# Altium schematic symbol library Analog Devices Operational Amplifiers.SchLib: 2102 symbols (part 24 of 35) (continued)
## ADA4084-2ARMZ-R7
designator U?
Double Channel Low Power Operational Amplifier, 12.3 MHz BW, 2.6 V/us SR, Industrial, 8-pin SOP (RM-8), Reel; Generic Part Number: ADA4084-2; Manufacturer: Analog Devices; PartNumber: ADA4084-2ARMZ-R7; Amplifiers Per Package: 2; Input Bias Current: 140nA; Input Offset Voltage: 100uV; Iq/Amp: 595uA; V Span Max: 30V; V Span Min: 3V; DatasheetVersion: Rev. B; PackageReference: RM-8; PackageDescription: 8-Pin Mini Small Outline Package, Body 3 x 3 mm, Pitch 0.65 mm; Supplier 1: Digi-Key; Supplier Part Number 1: ADA4084-2ARMZ-R7TR-ND; Supplier 2: Digi-Key; Supplier Part Number 2: ADA4084-2ARMZ-R7CT-ND; Supplier 3: Digi-Key; Supplier Part Number 3: ADA4084-2ARMZ-R7DKR-ND; Supplier 4: Newark; Supplier Part Number 4: 72T3470; Packing: Reel; Slew Rate: 2.6V/us; Small Signal Bandwidth: 12.3MHz; Mounting Technology: Surface Mount; Code_JEDEC: MO-187-AA; ComponentLink1Description: Manufacturer URL; ComponentLink1URL: http://www.analog.com/en/index.html; ComponentLink2Description: Datasheet; ComponentLink2URL: http://www.analog.com/static/imported-files/data_sheets/ADA4084-2.pdf; ComponentLink3Description: Package Specification; ComponentLink3URL: http://www.analog.com/static/imported-files/packages/PKG_PDF/MSOP%28RM%29/RM_8.pdf
footprint ADI-RM-8_N (SOP, 8-Leads, Body 3x3mm, Pitch 0.65mm, IPC Medium Density)
footprint ADI-RM-8_L (SOP, 8-Leads, Body 3x3mm, Pitch 0.65mm, IPC High Density)
footprint ADI-RM-8_M (SOP, 8-Leads, Body 3x3mm, Pitch 0.65mm, IPC Low Density)
pins on every part: 4 -V (power), 8 +V (power)
part A pins: 1 OUT A (out), 2 -IN A (in), 3 +IN A (in)
part B pins: 5 +IN B (in), 6 -IN B (in), 7 OUT B (out)

## ADA4084-2ARMZ-RL
designator U?
Double Channel Low Power Operational Amplifier, 12.3 MHz BW, 2.6 V/us SR, Industrial, 8-pin SOP (RM-8), Reel; Generic Part Number: ADA4084-2; Manufacturer: Analog Devices; PartNumber: ADA4084-2ARMZ-RL; Amplifiers Per Package: 2; Input Bias Current: 140nA; Input Offset Voltage: 100uV; Iq/Amp: 595uA; V Span Max: 30V; V Span Min: 3V; DatasheetVersion: Rev. B; PackageReference: RM-8; PackageDescription: 8-Pin Mini Small Outline Package, Body 3 x 3 mm, Pitch 0.65 mm; Supplier 1: Digi-Key; Supplier Part Number 1: ADA4084-2ARMZ-RL-ND; Supplier 2: Newark; Supplier Part Number 2: 72T3469; Packing: Reel; Slew Rate: 2.6V/us; Small Signal Bandwidth: 12.3MHz; Mounting Technology: Surface Mount; Code_JEDEC: MO-187-AA; ComponentLink1Description: Manufacturer URL; ComponentLink1URL: http://www.analog.com/en/index.html; ComponentLink2Description: Datasheet; ComponentLink2URL: http://www.analog.com/static/imported-files/data_sheets/ADA4084-2.pdf; ComponentLink3Description: Package Specification; ComponentLink3URL: http://www.analog.com/static/imported-files/packages/PKG_PDF/MSOP%28RM%29/RM_8.pdf
footprint ADI-RM-8_N (SOP, 8-Leads, Body 3x3mm, Pitch 0.65mm, IPC Medium Density)
footprint ADI-RM-8_L (SOP, 8-Leads, Body 3x3mm, Pitch 0.65mm, IPC High Density)
footprint ADI-RM-8_M (SOP, 8-Leads, Body 3x3mm, Pitch 0.65mm, IPC Low Density)
pins on every part: 4 -V (power), 8 +V (power)
part A pins: 1 OUT A (out), 2 -IN A (in), 3 +IN A (in)
part B pins: 5 +IN B (in), 6 -IN B (in), 7 OUT B (out)

## ADA4084-2ARZ
designator U?
Double Channel Low Power Operational Amplifier, 12.3 MHz BW, 2.6 V/us SR, Industrial, 8-pin SOIC (R-8), Tube; Generic Part Number: ADA4084-2; Manufacturer: Analog Devices; PartNumber: ADA4084-2ARZ; Amplifiers Per Package: 2; Input Bias Current: 140nA; Input Offset Voltage: 100uV; Iq/Amp: 595uA; V Span Max: 30V; V Span Min: 3V; DatasheetVersion: Rev. B; PackageVersion: 060506-A; PackageReference: R-8; PackageDescription: 8-Pin Standard Small Outline Package, Body 3.9 x 4.9 mm, Pitch 1.27 mm; Supplier 1: Digi-Key; Supplier Part Number 1: ADA4084-2ARZ-ND; Supplier 2: Farnell; Supplier Part Number 2: 2070703; Supplier 3: Newark; Supplier Part Number 3: 72T3471; Packing: Tube; Slew Rate: 2.6V/us; Small Signal Bandwidth: 12.3MHz; Mounting Technology: Surface Mount; Code_JEDEC: MS-012-AA; ComponentLink1Description: Manufacturer URL; ComponentLink1URL: http://www.analog.com/en/index.html; ComponentLink2Description: Datasheet; ComponentLink2URL: http://www.analog.com/static/imported-files/data_sheets/ADA4084-2.pdf; ComponentLink3Description: Package Specification; ComponentLink3URL: http://www.analog.com/static/imported-files/packages/PKG_PDF/SOIC_Narrow%20(R)/R_8.pdf
footprint ADI-R-8_N (SOIC, 8-Leads, Body 4.9x3.9mm, Pitch 1.27mm, IPC Medium Density)
footprint ADI-R-8_L (SOIC, 8-Leads, Body 4.9x3.9mm, Pitch 1.27mm, IPC High Density)
footprint ADI-R-8_M (SOIC, 8-Leads, Body 4.9x3.9mm, Pitch 1.27mm, IPC Low Density)
pins on every part: 4 -V (power), 8 +V (power)
part A pins: 1 OUT A (out), 2 -IN A (in), 3 +IN A (in)
part B pins: 5 +IN B (in), 6 -IN B (in), 7 OUT B (out)

## ADA4084-2ARZ-R7
designator U?
Double Channel Low Power Operational Amplifier, 12.3 MHz BW, 2.6 V/us SR, Industrial, 8-pin SOIC (R-8), Reel; Generic Part Number: ADA4084-2; Manufacturer: Analog Devices; PartNumber: ADA4084-2ARZ-R7; Amplifiers Per Package: 2; Input Bias Current: 140nA; Input Offset Voltage: 100uV; Iq/Amp: 595uA; V Span Max: 30V; V Span Min: 3V; DatasheetVersion: Rev. B; PackageVersion: 060506-A; PackageReference: R-8; PackageDescription: 8-Pin Standard Small Outline Package, Body 3.9 x 4.9 mm, Pitch 1.27 mm; Supplier 1: Digi-Key; Supplier Part Number 1: ADA4084-2ARZ-R7TR-ND; Supplier 2: Digi-Key; Supplier Part Number 2: ADA4084-2ARZ-R7CT-ND; Supplier 3: Digi-Key; Supplier Part Number 3: ADA4084-2ARZ-R7DKR-ND; Supplier 4: Newark; Supplier Part Number 4: 72T3473; Packing: Reel; Slew Rate: 2.6V/us; Small Signal Bandwidth: 12.3MHz; Mounting Technology: Surface Mount; Code_JEDEC: MS-012-AA; ComponentLink1Description: Manufacturer URL; ComponentLink1URL: http://www.analog.com/en/index.html; ComponentLink2Description: Datasheet; ComponentLink2URL: http://www.analog.com/static/imported-files/data_sheets/ADA4084-2.pdf; ComponentLink3Description: Package Specification; ComponentLink3URL: http://www.analog.com/static/imported-files/packages/PKG_PDF/SOIC_Narrow%20(R)/R_8.pdf
footprint ADI-R-8_N (SOIC, 8-Leads, Body 4.9x3.9mm, Pitch 1.27mm, IPC Medium Density)
footprint ADI-R-8_L (SOIC, 8-Leads, Body 4.9x3.9mm, Pitch 1.27mm, IPC High Density)
footprint ADI-R-8_M (SOIC, 8-Leads, Body 4.9x3.9mm, Pitch 1.27mm, IPC Low Density)
pins on every part: 4 -V (power), 8 +V (power)
part A pins: 1 OUT A (out), 2 -IN A (in), 3 +IN A (in)
part B pins: 5 +IN B (in), 6 -IN B (in), 7 OUT B (out)

## ADA4084-2ARZ-RL
designator U?
Double Channel Low Power Operational Amplifier, 12.3 MHz BW, 2.6 V/us SR, Industrial, 8-pin SOIC (R-8), Reel; Generic Part Number: ADA4084-2; Manufacturer: Analog Devices; PartNumber: ADA4084-2ARZ-RL; Amplifiers Per Package: 2; Input Bias Current: 140nA; Input Offset Voltage: 100uV; Iq/Amp: 595uA; V Span Max: 30V; V Span Min: 3V; DatasheetVersion: Rev. B; PackageVersion: 060506-A; PackageReference: R-8; PackageDescription: 8-Pin Standard Small Outline Package, Body 3.9 x 4.9 mm, Pitch 1.27 mm; Supplier 1: Digi-Key; Supplier Part Number 1: ADA4084-2ARZ-RL-ND; Packing: Reel; Slew Rate: 2.6V/us; Small Signal Bandwidth: 12.3MHz; Mounting Technology: Surface Mount; Code_JEDEC: MS-012-AA; ComponentLink1Description: Manufacturer URL; ComponentLink1URL: http://www.analog.com/en/index.html; ComponentLink2Description: Datasheet; ComponentLink2URL: http://www.analog.com/static/imported-files/data_sheets/ADA4084-2.pdf; ComponentLink3Description: Package Specification; ComponentLink3URL: http://www.analog.com/static/imported-files/packages/PKG_PDF/SOIC_Narrow%20(R)/R_8.pdf
footprint ADI-R-8_N (SOIC, 8-Leads, Body 4.9x3.9mm, Pitch 1.27mm, IPC Medium Density)
footprint ADI-R-8_L (SOIC, 8-Leads, Body 4.9x3.9mm, Pitch 1.27mm, IPC High Density)
footprint ADI-R-8_M (SOIC, 8-Leads, Body 4.9x3.9mm, Pitch 1.27mm, IPC Low Density)
pins on every part: 4 -V (power), 8 +V (power)
part A pins: 1 OUT A (out), 2 -IN A (in), 3 +IN A (in)
part B pins: 5 +IN B (in), 6 -IN B (in), 7 OUT B (out)

## ADA4091-2ACPZ-R2
designator U?
Double Channel Rail-to-Rail Operational Amplifier, 1.27 MHz BW, 460 mV/us SR, Industrial, 8-pin QFN (CP-8-9), Reel; Generic Part Number: ADA4091-2; Manufacturer: Analog Devices; PartNumber: ADA4091-2ACPZ-R2; Amplifiers Per Package: 2; Input Bias Current: 50nA; Input Offset Voltage: 35uV; Iq/Amp: 200uA; V Span Max: 30V; V Span Min: 3V; DatasheetVersion: Rev. F; PackageVersion: 051909-A; PackageReference: CP-8-9; PackageDescription: 8-Pin Lead Frame Chip Scale Package, Body 3 x 3 mm, Pitch 0.5 mm; Supplier 1: Digi-Key; Supplier Part Number 1: ADA4091-2ACPZ-R2TR-ND; Supplier 2: Digi-Key; Supplier Part Number 2: ADA4091-2ACPZ-R2CT-ND; Supplier 3: Digi-Key; Supplier Part Number 3: ADA4091-2ACPZ-R2DKR-ND; Supplier 4: Newark; Supplier Part Number 4: 52R8019; Slew Rate: 460mV/us; Small Signal Bandwidth: 1.27MHz; Mounting Technology: Surface Mount; ComponentLink1Description: Manufacturer URL; ComponentLink1URL: http://www.analog.com/en/index.html; ComponentLink2Description: Datasheet; ComponentLink2URL: http://www.analog.com/static/imported-files/data_sheets/ADA4091-2_4091-4.pdf; ComponentLink3Description: Package Specification; ComponentLink3URL: http://www.analog.com/static/imported-files/packages/PKG_PDF/LFCSP(CP)/CP_8_9.pdf; ComponentLink4Description: Reference Circuit; ComponentLink4URL: http://www.analog.com/en/all-operational-amplifiers-op-amps/operational-amplifiers-op-amps/ada4091-2/products/product.html#product-recommendations
footprint ADI-CP-8-9_N (QFN, 8-Leads, Body 3x3mm, Pitch 0.5mm, Thermal Pad 1.5x2.13mm, IPC Medium Density)
footprint ADI-CP-8-9_L (QFN, 8-Leads, Body 3x3mm, Pitch 0.5mm, Thermal Pad 1.5x2.13mm, IPC High Density)
footprint ADI-CP-8-9_M (QFN, 8-Leads, Body 3x3mm, Pitch 0.5mm, Thermal Pad 1.5x2.13mm, IPC Low Density)
pins on every part: 4 -V (power), 8 +V (power), 9 EP (power)
part A pins: 1 OUT A (out), 2 -IN A (in), 3 +IN A (in)
part B pins: 5 +IN B (in), 6 -IN B (in), 7 OUT B (out)

## ADA4091-2ACPZ-R7
designator U?
Double Channel Rail-to-Rail Operational Amplifier, 1.27 MHz BW, 460 mV/us SR, Industrial, 8-pin QFN (CP-8-9), Reel; Generic Part Number: ADA4091-2; Manufacturer: Analog Devices; PartNumber: ADA4091-2ACPZ-R7; Amplifiers Per Package: 2; Input Bias Current: 50nA; Input Offset Voltage: 35uV; Iq/Amp: 200uA; V Span Max: 30V; V Span Min: 3V; DatasheetVersion: Rev. F; PackageVersion: 051909-A; PackageReference: CP-8-9; PackageDescription: 8-Pin Lead Frame Chip Scale Package, Body 3 x 3 mm, Pitch 0.5 mm; Supplier 1: Digi-Key; Supplier Part Number 1: ADA4091-2ACPZ-R7-ND; Supplier 2: Newark; Supplier Part Number 2: 52R8020; Slew Rate: 460mV/us; Small Signal Bandwidth: 1.27MHz; Mounting Technology: Surface Mount; ComponentLink1Description: Manufacturer URL; ComponentLink1URL: http://www.analog.com/en/index.html; ComponentLink2Description: Datasheet; ComponentLink2URL: http://www.analog.com/static/imported-files/data_sheets/ADA4091-2_4091-4.pdf; ComponentLink3Description: Package Specification; ComponentLink3URL: http://www.analog.com/static/imported-files/packages/PKG_PDF/LFCSP(CP)/CP_8_9.pdf; ComponentLink4Description: Reference Circuit; ComponentLink4URL: http://www.analog.com/en/all-operational-amplifiers-op-amps/operational-amplifiers-op-amps/ada4091-2/products/product.html#product-recommendations
footprint ADI-CP-8-9_N (QFN, 8-Leads, Body 3x3mm, Pitch 0.5mm, Thermal Pad 1.5x2.13mm, IPC Medium Density)
footprint ADI-CP-8-9_L (QFN, 8-Leads, Body 3x3mm, Pitch 0.5mm, Thermal Pad 1.5x2.13mm, IPC High Density)
footprint ADI-CP-8-9_M (QFN, 8-Leads, Body 3x3mm, Pitch 0.5mm, Thermal Pad 1.5x2.13mm, IPC Low Density)
pins on every part: 4 -V (power), 8 +V (power), 9 EP (power)
part A pins: 1 OUT A (out), 2 -IN A (in), 3 +IN A (in)
part B pins: 5 +IN B (in), 6 -IN B (in), 7 OUT B (out)

## ADA4091-2ACPZ-RL
designator U?
Double Channel Rail-to-Rail Operational Amplifier, 1.27 MHz BW, 460 mV/us SR, Industrial, 8-pin QFN (CP-8-9), Reel; Generic Part Number: ADA4091-2; Manufacturer: Analog Devices; PartNumber: ADA4091-2ACPZ-RL; Amplifiers Per Package: 2; Input Bias Current: 50nA; Input Offset Voltage: 35uV; Iq/Amp: 200uA; V Span Max: 30V; V Span Min: 3V; DatasheetVersion: Rev. F; PackageVersion: 051909-A; PackageReference: CP-8-9; PackageDescription: 8-Pin Lead Frame Chip Scale Package, Body 3 x 3 mm, Pitch 0.5 mm; Supplier 1: Digi-Key; Supplier Part Number 1: ADA4091-2ACPZ-RL-ND; Slew Rate: 460mV/us; Small Signal Bandwidth: 1.27MHz; Mounting Technology: Surface Mount; ComponentLink1Description: Manufacturer URL; ComponentLink1URL: http://www.analog.com/en/index.html; ComponentLink2Description: Datasheet; ComponentLink2URL: http://www.analog.com/static/imported-files/data_sheets/ADA4091-2_4091-4.pdf; ComponentLink3Description: Package Specification; ComponentLink3URL: http://www.analog.com/static/imported-files/packages/PKG_PDF/LFCSP(CP)/CP_8_9.pdf; ComponentLink4Description: Reference Circuit; ComponentLink4URL: http://www.analog.com/en/all-operational-amplifiers-op-amps/operational-amplifiers-op-amps/ada4091-2/products/product.html#product-recommendations
footprint ADI-CP-8-9_N (QFN, 8-Leads, Body 3x3mm, Pitch 0.5mm, Thermal Pad 1.5x2.13mm, IPC Medium Density)
footprint ADI-CP-8-9_L (QFN, 8-Leads, Body 3x3mm, Pitch 0.5mm, Thermal Pad 1.5x2.13mm, IPC High Density)
footprint ADI-CP-8-9_M (QFN, 8-Leads, Body 3x3mm, Pitch 0.5mm, Thermal Pad 1.5x2.13mm, IPC Low Density)
pins on every part: 4 -V (power), 8 +V (power), 9 EP (power)
part A pins: 1 OUT A (out), 2 -IN A (in), 3 +IN A (in)
part B pins: 5 +IN B (in), 6 -IN B (in), 7 OUT B (out)

## ADA4091-2ARZ
designator U?
Double Channel Rail-to-Rail Operational Amplifier, 1.27 MHz BW, 460 mV/us SR, Industrial, 8-pin SOIC (R-8), Tube; Generic Part Number: ADA4091-2; Manufacturer: Analog Devices; PartNumber: ADA4091-2ARZ; Amplifiers Per Package: 2; Input Bias Current: 50nA; Input Offset Voltage: 35uV; Iq/Amp: 200uA; V Span Max: 30V; V Span Min: 3V; DatasheetVersion: Rev. F; PackageVersion: 060506-A; PackageReference: R-8; PackageDescription: 8-Pin Standard Small Outline Package, Body 3.9 x 4.9 mm, Pitch 1.27 mm; Supplier 1: Digi-Key; Supplier Part Number 1: ADA4091-2ARZ-ND; Supplier 2: Farnell; Supplier Part Number 2: 1702289; Supplier 3: Newark; Supplier Part Number 3: 34P2964; Slew Rate: 460mV/us; Small Signal Bandwidth: 1.27MHz; Mounting Technology: Surface Mount; Code_JEDEC: MS-012-AA; ComponentLink1Description: Manufacturer URL; ComponentLink1URL: http://www.analog.com/en/index.html; ComponentLink2Description: Datasheet; ComponentLink2URL: http://www.analog.com/static/imported-files/data_sheets/ADA4091-2_4091-4.pdf; ComponentLink3Description: Package Specification; ComponentLink3URL: http://www.analog.com/static/imported-files/packages/PKG_PDF/SOIC_Narrow%20(R)/R_8.pdf; ComponentLink4Description: Reference Circuit; ComponentLink4URL: http://www.analog.com/en/all-operational-amplifiers-op-amps/operational-amplifiers-op-amps/ada4091-2/products/product.html#product-recommendations
footprint ADI-R-8_N (SOIC, 8-Leads, Body 4.9x3.9mm, Pitch 1.27mm, IPC Medium Density)
footprint ADI-R-8_L (SOIC, 8-Leads, Body 4.9x3.9mm, Pitch 1.27mm, IPC High Density)
footprint ADI-R-8_M (SOIC, 8-Leads, Body 4.9x3.9mm, Pitch 1.27mm, IPC Low Density)
pins on every part: 4 -V (power), 8 +V (power)
part A pins: 1 OUT A (out), 2 -IN A (in), 3 +IN A (in)
part B pins: 5 +IN B (in), 6 -IN B (in), 7 OUT B (out)

## ADA4091-2ARZ-R7
designator U?
Double Channel Rail-to-Rail Operational Amplifier, 1.27 MHz BW, 460 mV/us SR, Industrial, 8-pin SOIC (R-8), Reel; Generic Part Number: ADA4091-2; Manufacturer: Analog Devices; PartNumber: ADA4091-2ARZ-R7; Amplifiers Per Package: 2; Input Bias Current: 50nA; Input Offset Voltage: 35uV; Iq/Amp: 200uA; V Span Max: 30V; V Span Min: 3V; DatasheetVersion: Rev. F; PackageVersion: 060506-A; PackageReference: R-8; PackageDescription: 8-Pin Standard Small Outline Package, Body 3.9 x 4.9 mm, Pitch 1.27 mm; Supplier 1: Digi-Key; Supplier Part Number 1: ADA4091-2ARZ-R7-ND; Supplier 2: Newark; Supplier Part Number 2: 34P2966; Slew Rate: 460mV/us; Small Signal Bandwidth: 1.27MHz; Mounting Technology: Surface Mount; Code_JEDEC: MS-012-AA; ComponentLink1Description: Manufacturer URL; ComponentLink1URL: http://www.analog.com/en/index.html; ComponentLink2Description: Datasheet; ComponentLink2URL: http://www.analog.com/static/imported-files/data_sheets/ADA4091-2_4091-4.pdf; ComponentLink3Description: Package Specification; ComponentLink3URL: http://www.analog.com/static/imported-files/packages/PKG_PDF/SOIC_Narrow%20(R)/R_8.pdf; ComponentLink4Description: Reference Circuit; ComponentLink4URL: http://www.analog.com/en/all-operational-amplifiers-op-amps/operational-amplifiers-op-amps/ada4091-2/products/product.html#product-recommendations
footprint ADI-R-8_N (SOIC, 8-Leads, Body 4.9x3.9mm, Pitch 1.27mm, IPC Medium Density)
footprint ADI-R-8_L (SOIC, 8-Leads, Body 4.9x3.9mm, Pitch 1.27mm, IPC High Density)
footprint ADI-R-8_M (SOIC, 8-Leads, Body 4.9x3.9mm, Pitch 1.27mm, IPC Low Density)
pins on every part: 4 -V (power), 8 +V (power)
part A pins: 1 OUT A (out), 2 -IN A (in), 3 +IN A (in)
part B pins: 5 +IN B (in), 6 -IN B (in), 7 OUT B (out)

## ADA4091-2ARZ-RL
designator U?
Double Channel Rail-to-Rail Operational Amplifier, 1.27 MHz BW, 460 mV/us SR, Industrial, 8-pin SOIC (R-8), Reel; Generic Part Number: ADA4091-2; Manufacturer: Analog Devices; PartNumber: ADA4091-2ARZ-RL; Amplifiers Per Package: 2; Input Bias Current: 50nA; Input Offset Voltage: 35uV; Iq/Amp: 200uA; V Span Max: 30V; V Span Min: 3V; DatasheetVersion: Rev. F; PackageVersion: 060506-A; PackageReference: R-8; PackageDescription: 8-Pin Standard Small Outline Package, Body 3.9 x 4.9 mm, Pitch 1.27 mm; Supplier 1: Digi-Key; Supplier Part Number 1: ADA4091-2ARZ-RL-ND; Supplier 2: Newark; Supplier Part Number 2: 34P2965; Slew Rate: 460mV/us; Small Signal Bandwidth: 1.27MHz; Mounting Technology: Surface Mount; Code_JEDEC: MS-012-AA; ComponentLink1Description: Manufacturer URL; ComponentLink1URL: http://www.analog.com/en/index.html; ComponentLink2Description: Datasheet; ComponentLink2URL: http://www.analog.com/static/imported-files/data_sheets/ADA4091-2_4091-4.pdf; ComponentLink3Description: Package Specification; ComponentLink3URL: http://www.analog.com/static/imported-files/packages/PKG_PDF/SOIC_Narrow%20(R)/R_8.pdf; ComponentLink4Description: Reference Circuit; ComponentLink4URL: http://www.analog.com/en/all-operational-amplifiers-op-amps/operational-amplifiers-op-amps/ada4091-2/products/product.html#product-recommendations
footprint ADI-R-8_N (SOIC, 8-Leads, Body 4.9x3.9mm, Pitch 1.27mm, IPC Medium Density)
footprint ADI-R-8_L (SOIC, 8-Leads, Body 4.9x3.9mm, Pitch 1.27mm, IPC High Density)
footprint ADI-R-8_M (SOIC, 8-Leads, Body 4.9x3.9mm, Pitch 1.27mm, IPC Low Density)
pins on every part: 4 -V (power), 8 +V (power)
part A pins: 1 OUT A (out), 2 -IN A (in), 3 +IN A (in)
part B pins: 5 +IN B (in), 6 -IN B (in), 7 OUT B (out)

## ADA4091-4ACPZ-R2
designator U?
Quad Channel Rail-to-Rail Operational Amplifier, 1.27 MHz BW, 460 mV/us SR, Industrial, 16-pin QFN (CP-16-17), Reel; Generic Part Number: ADA4091-4; Manufacturer: Analog Devices; PartNumber: ADA4091-4ACPZ-R2; Amplifiers Per Package: 4; Input Bias Current: 50nA; Input Offset Voltage: 35uV; Iq/Amp: 200uA; V Span Max: 30V; V Span Min: 3V; DatasheetVersion: Rev. F; PackageVersion: 08-16-2010-C; PackageReference: CP-16-17; PackageDescription: 16-Pin Lead Frame Chip Scale Package, Body 4 x 4 mm, Pitch 0.65 mm; Supplier 1: Digi-Key; Supplier Part Number 1: ADA4091-4ACPZ-R2TR-ND; Supplier 2: Digi-Key; Supplier Part Number 2: ADA4091-4ACPZ-R2CT-ND; Supplier 3: Digi-Key; Supplier Part Number 3: ADA4091-4ACPZ-R2DKR-ND; Supplier 4: Newark; Supplier Part Number 4: 74R5830; Slew Rate: 460mV/us; Small Signal Bandwidth: 1.27MHz; Mounting Technology: Surface Mount; Code_JEDEC: MO-220-WGGC; ComponentLink1Description: Manufacturer URL; ComponentLink1URL: http://www.analog.com/en/index.html; ComponentLink2Description: Datasheet; ComponentLink2URL: http://www.analog.com/static/imported-files/data_sheets/ADA4091-2_4091-4.pdf; ComponentLink3Description: Package Specification; ComponentLink3URL: http://www.analog.com/static/imported-files/packages/PKG_PDF/LFCSP(CP)/CP_16_17.pdf; ComponentLink4Description: Reference Circuit; ComponentLink4URL: http://www.analog.com/en/all-operational-amplifiers-op-amps/operational-amplifiers-op-amps/ada4091-4/products/product.html#product-recommendations
footprint ADI-CP-16-17_N (QFN, 16-Leads, Body 4x4mm, Pitch 0.65mm, Thermal Pad 2.60x2.60mm, IPC Medium Density)
footprint ADI-CP-16-17_L (QFN, 16-Leads, Body 4x4mm, Pitch 0.65mm, Thermal Pad 2.60x2.60mm, IPC High Density)
footprint ADI-CP-16-17_M (QFN, 16-Leads, Body 4x4mm, Pitch 0.65mm, Thermal Pad 2.60x2.60mm, IPC Low Density)
part A pins: 1 -IN A (in), 2 +IN A (in), 15 OUT A (out)
part B pins: 4 +IN B (in), 5 -IN B (in), 6 OUT B (out)
part C pins: 7 OUT C (out), 8 -IN C (in), 9 +IN C (in)
part D pins: 11 +IN D (in), 12 -IN D (in), 14 OUT D (out)
part E pins: 3 +V (power), 10 -V (power), 13 NC, 16 NC, 17 EP (power) "IT IS RECOMMENDED THAT THE EXPOSED PAD BE CONNECTED TO V-."

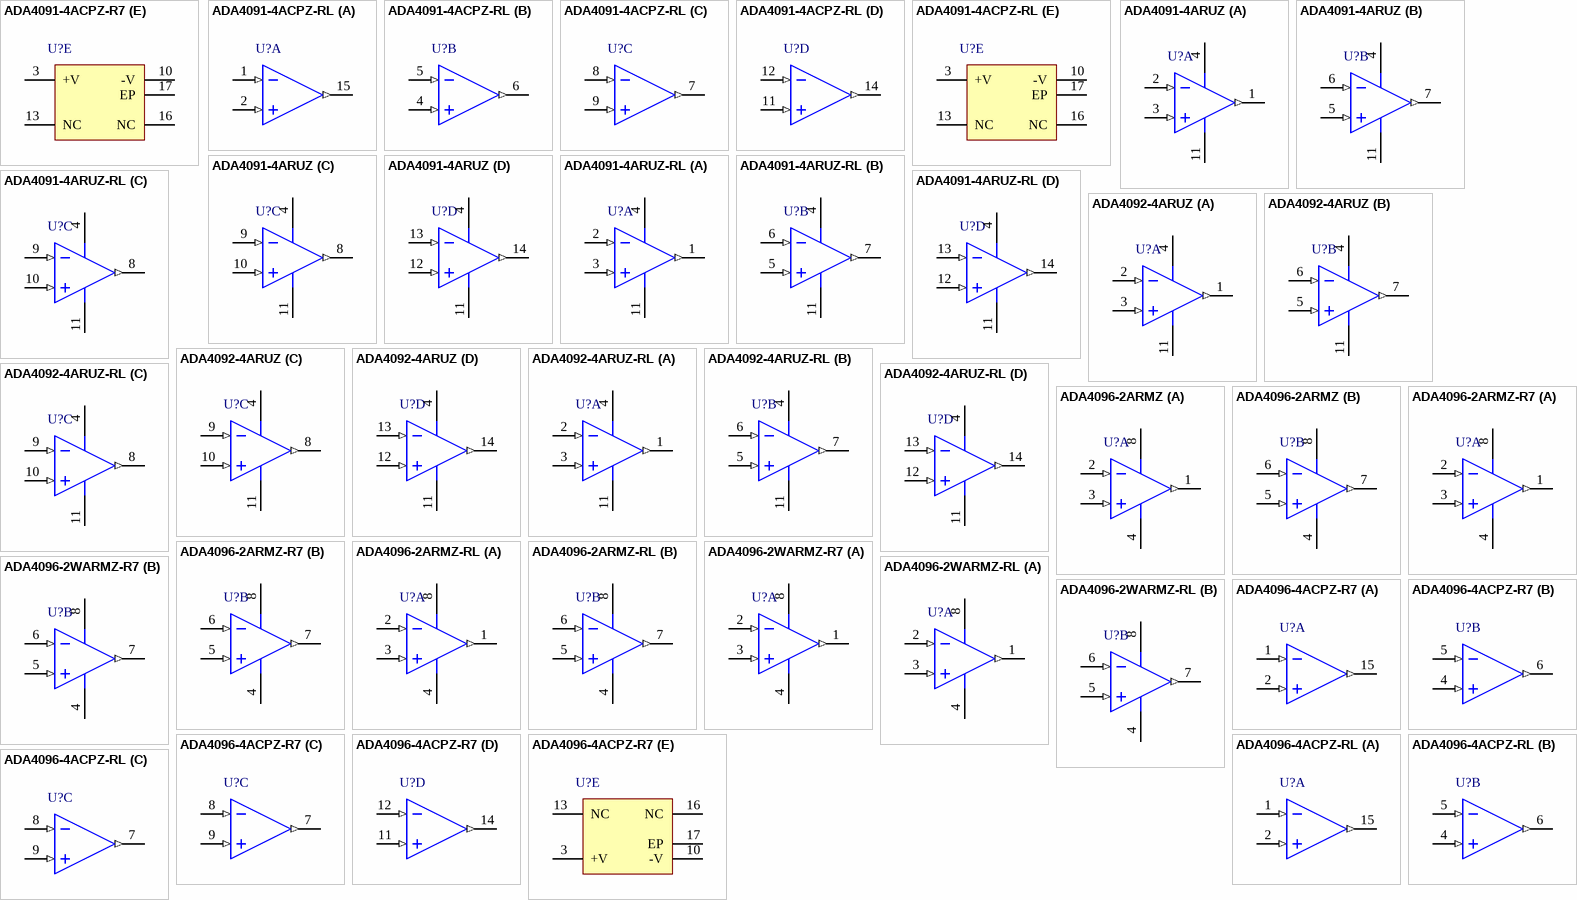
[diagram p77: symbols ADA4091-4ACPZ-R7 to ADA4096-4ACPZ-RL]

## ADA4091-4ACPZ-R7
designator U?
Quad Channel Rail-to-Rail Operational Amplifier, 1.27 MHz BW, 460 mV/us SR, Industrial, 16-pin QFN (CP-16-17), Reel; Generic Part Number: ADA4091-4; Manufacturer: Analog Devices; PartNumber: ADA4091-4ACPZ-R7; Amplifiers Per Package: 4; Input Bias Current: 50nA; Input Offset Voltage: 35uV; Iq/Amp: 200uA; V Span Max: 30V; V Span Min: 3V; DatasheetVersion: Rev. F; PackageVersion: 08-16-2010-C; PackageReference: CP-16-17; PackageDescription: 16-Pin Lead Frame Chip Scale Package, Body 4 x 4 mm, Pitch 0.65 mm; Supplier 1: Digi-Key; Supplier Part Number 1: ADA4091-4ACPZ-R7-ND; Supplier 2: Newark; Supplier Part Number 2: 74R5831; Slew Rate: 460mV/us; Small Signal Bandwidth: 1.27MHz; Mounting Technology: Surface Mount; Code_JEDEC: MO-220-WGGC; ComponentLink1Description: Manufacturer URL; ComponentLink1URL: http://www.analog.com/en/index.html; ComponentLink2Description: Datasheet; ComponentLink2URL: http://www.analog.com/static/imported-files/data_sheets/ADA4091-2_4091-4.pdf; ComponentLink3Description: Package Specification; ComponentLink3URL: http://www.analog.com/static/imported-files/packages/PKG_PDF/LFCSP(CP)/CP_16_17.pdf; ComponentLink4Description: Reference Circuit; ComponentLink4URL: http://www.analog.com/en/all-operational-amplifiers-op-amps/operational-amplifiers-op-amps/ada4091-4/products/product.html#product-recommendations
footprint ADI-CP-16-17_N (QFN, 16-Leads, Body 4x4mm, Pitch 0.65mm, Thermal Pad 2.60x2.60mm, IPC Medium Density)
footprint ADI-CP-16-17_L (QFN, 16-Leads, Body 4x4mm, Pitch 0.65mm, Thermal Pad 2.60x2.60mm, IPC High Density)
footprint ADI-CP-16-17_M (QFN, 16-Leads, Body 4x4mm, Pitch 0.65mm, Thermal Pad 2.60x2.60mm, IPC Low Density)
part A pins: 1 -IN A (in), 2 +IN A (in), 15 OUT A (out)
part B pins: 4 +IN B (in), 5 -IN B (in), 6 OUT B (out)
part C pins: 7 OUT C (out), 8 -IN C (in), 9 +IN C (in)
part D pins: 11 +IN D (in), 12 -IN D (in), 14 OUT D (out)
part E pins: 3 +V (power), 10 -V (power), 13 NC, 16 NC, 17 EP (power) "IT IS RECOMMENDED THAT THE EXPOSED PAD BE CONNECTED TO V-."

## ADA4091-4ACPZ-RL
designator U?
Quad Channel Rail-to-Rail Operational Amplifier, 1.27 MHz BW, 460 mV/us SR, Industrial, 16-pin QFN (CP-16-17), Reel; Generic Part Number: ADA4091-4; Manufacturer: Analog Devices; PartNumber: ADA4091-4ACPZ-RL; Amplifiers Per Package: 4; Input Bias Current: 50nA; Input Offset Voltage: 35uV; Iq/Amp: 200uA; V Span Max: 30V; V Span Min: 3V; DatasheetVersion: Rev. F; PackageVersion: 08-16-2010-C; PackageReference: CP-16-17; PackageDescription: 16-Pin Lead Frame Chip Scale Package, Body 4 x 4 mm, Pitch 0.65 mm; Supplier 1: Digi-Key; Supplier Part Number 1: ADA4091-4ACPZ-RL-ND; Slew Rate: 460mV/us; Small Signal Bandwidth: 1.27MHz; Mounting Technology: Surface Mount; Code_JEDEC: MO-220-WGGC; ComponentLink1Description: Manufacturer URL; ComponentLink1URL: http://www.analog.com/en/index.html; ComponentLink2Description: Datasheet; ComponentLink2URL: http://www.analog.com/static/imported-files/data_sheets/ADA4091-2_4091-4.pdf; ComponentLink3Description: Package Specification; ComponentLink3URL: http://www.analog.com/static/imported-files/packages/PKG_PDF/LFCSP(CP)/CP_16_17.pdf; ComponentLink4Description: Reference Circuit; ComponentLink4URL: http://www.analog.com/en/all-operational-amplifiers-op-amps/operational-amplifiers-op-amps/ada4091-4/products/product.html#product-recommendations
footprint ADI-CP-16-17_N (QFN, 16-Leads, Body 4x4mm, Pitch 0.65mm, Thermal Pad 2.60x2.60mm, IPC Medium Density)
footprint ADI-CP-16-17_L (QFN, 16-Leads, Body 4x4mm, Pitch 0.65mm, Thermal Pad 2.60x2.60mm, IPC High Density)
footprint ADI-CP-16-17_M (QFN, 16-Leads, Body 4x4mm, Pitch 0.65mm, Thermal Pad 2.60x2.60mm, IPC Low Density)
part A pins: 1 -IN A (in), 2 +IN A (in), 15 OUT A (out)
part B pins: 4 +IN B (in), 5 -IN B (in), 6 OUT B (out)
part C pins: 7 OUT C (out), 8 -IN C (in), 9 +IN C (in)
part D pins: 11 +IN D (in), 12 -IN D (in), 14 OUT D (out)
part E pins: 3 +V (power), 10 -V (power), 13 NC, 16 NC, 17 EP (power) "IT IS RECOMMENDED THAT THE EXPOSED PAD BE CONNECTED TO V-."

## ADA4091-4ARUZ
designator U?
Quad Channel Rail-to-Rail Operational Amplifier, 1.27 MHz BW, 460 mV/us SR, Industrial, 14-pin SOP (RU-14), Tube; Generic Part Number: ADA4091-4; Manufacturer: Analog Devices; PartNumber: ADA4091-4ARUZ; Amplifiers Per Package: 4; Input Bias Current: 50nA; Input Offset Voltage: 35uV; Iq/Amp: 200uA; V Span Max: 30V; V Span Min: 3V; DatasheetVersion: Rev. F; PackageReference: RU-14; PackageDescription: 14-Pin Thin Shrink Small Outline Package, Body 5 x 4.4 mm, Pitch 0.65 mm; Supplier 1: Digi-Key; Supplier Part Number 1: ADA4091-4ARUZ-ND; Supplier 2: Farnell; Supplier Part Number 2: 1827375; Supplier 3: Newark; Supplier Part Number 3: 26R2390; Slew Rate: 460mV/us; Small Signal Bandwidth: 1.27MHz; Mounting Technology: Surface Mount; Code_JEDEC: MO-153AB-1; ComponentLink1Description: Manufacturer URL; ComponentLink1URL: http://www.analog.com/en/index.html; ComponentLink2Description: Datasheet; ComponentLink2URL: http://www.analog.com/static/imported-files/data_sheets/ADA4091-2_4091-4.pdf; ComponentLink3Description: Package Specification; ComponentLink3URL: http://www.analog.com/static/imported-files/packages/36057385283879153717235186773RU14.pdf; ComponentLink4Description: Reference Circuit; ComponentLink4URL: http://www.analog.com/en/all-operational-amplifiers-op-amps/operational-amplifiers-op-amps/ada4091-4/products/product.html#product-recommendations
footprint ADI-RU-14_N (SOP, 14-Leads, Body 5x4.4mm, Pitch 0.65mm, IPC Medium Density)
footprint ADI-RU-14_L (SOP, 14-Leads, Body 5x4.4mm, Pitch 0.65mm, IPC High Density)
footprint ADI-RU-14_M (SOP, 14-Leads, Body 5x4.4mm, Pitch 0.65mm, IPC Low Density)
pins on every part: 4 +V (power), 11 -V (power)
part A pins: 1 OUT A (out), 2 -IN A (in), 3 +IN A (in)
part B pins: 5 +IN B (in), 6 -IN B (in), 7 OUT B (out)
part C pins: 8 OUT C (out), 9 -IN C (in), 10 +IN C (in)
part D pins: 12 +IN D (in), 13 -IN D (in), 14 OUT D (out)